# Altium footprint library RODION.PcbLib: 131 footprints (part 6 of 9)
Each footprint in its own frame and in the unit in brackets; x right, y up, seen from the top. Pads: shape width x height; smd on the part's side, far side on the other; paste and mask are expansions set on the pad; w line width, h text height; cw(c..) or ccw(c..) is an arc to the next point about the centre after c.
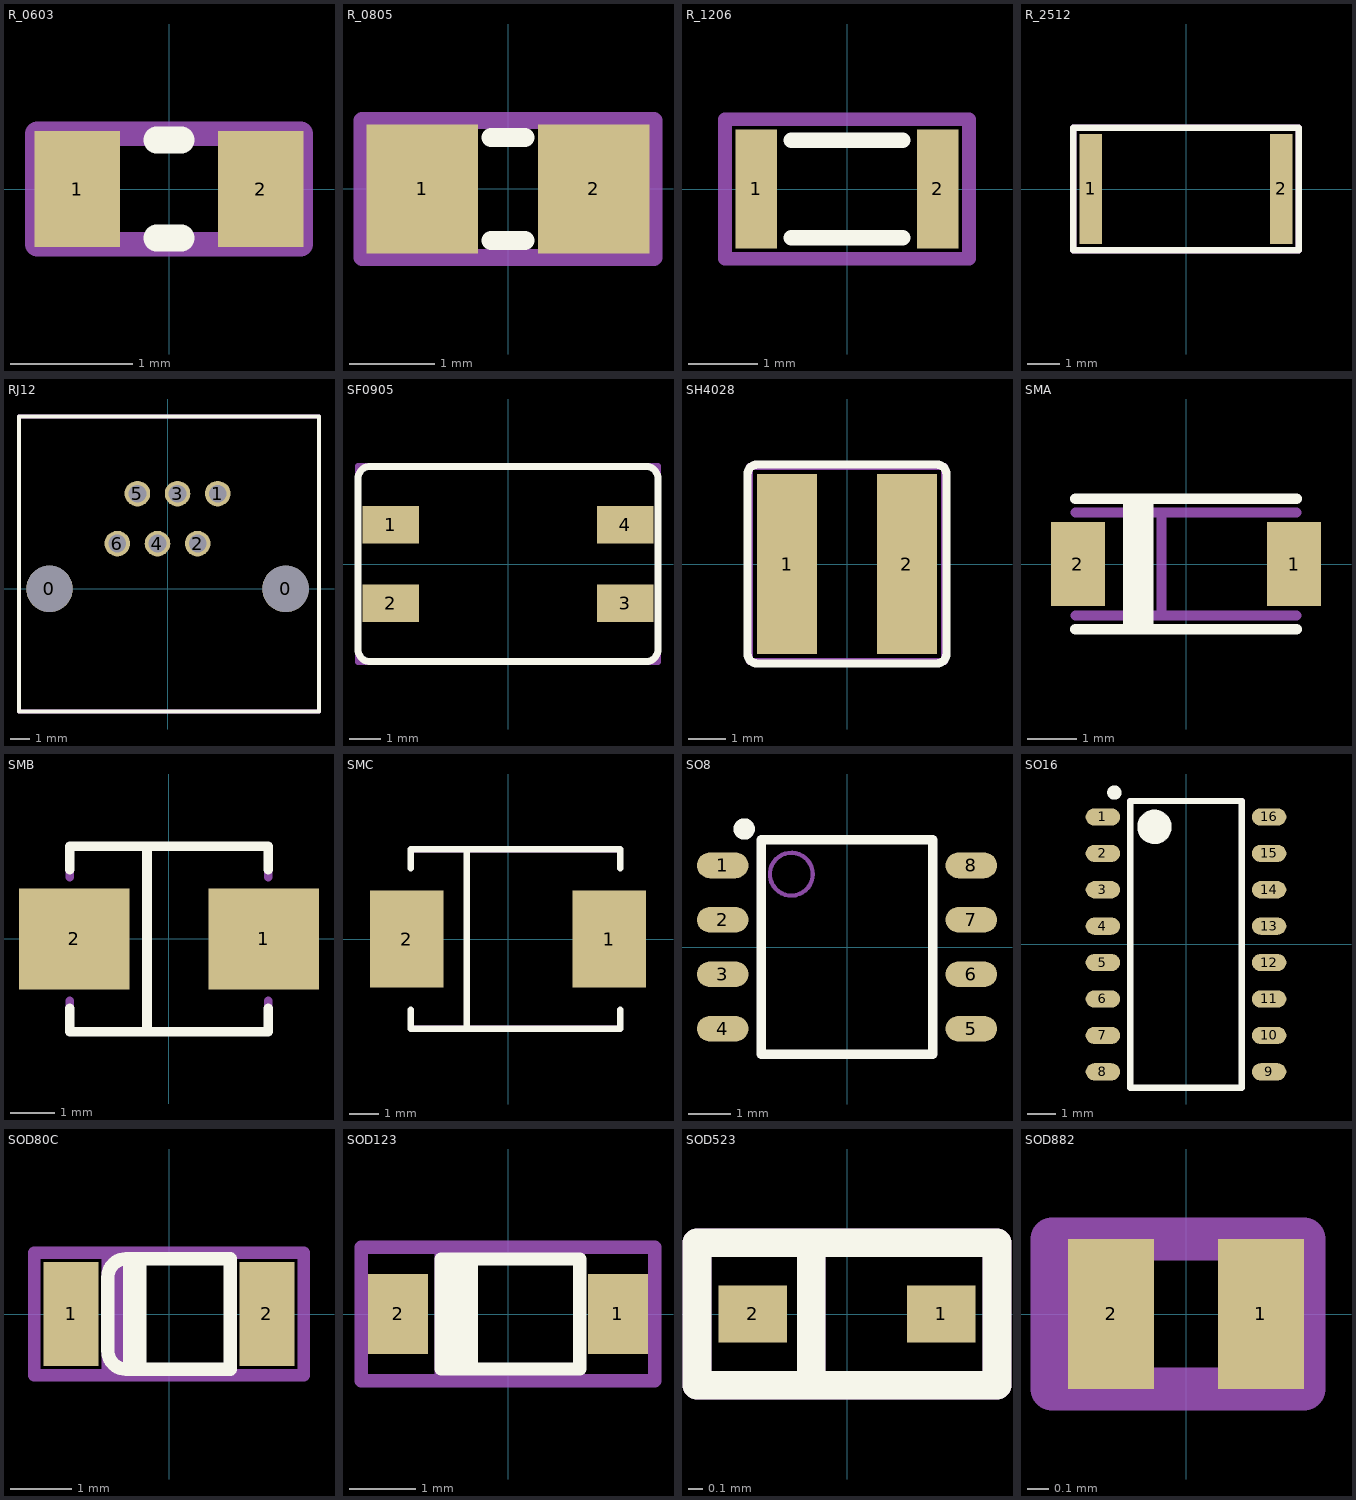
[diagram p5: the footprints below, top view; thin cyan lines are the x and y axes]

## R_0603 [mm] "Chip, Body 1.6x0.85mm, IPC High Density"
height 0.9
pads (2):
  rect 0.7x0.95 smd mask+0.05: 1(-0.75,0) 2(0.75,0)
Top Overlay:
  lines w0.22: -0.1,-0.4 0.1,-0.4 ; -0.1,0.4 0.1,0.4
Top_Assy:
  lines w0.2: -1.075,-0.45 -1.075,0.45 1.075,0.45 1.075,-0.45 -1.075,-0.45
  text ".Designator" at -1.775,-0.075 h1
3D body "RES0603.stp": height 0.45, standoff 0, extent -0.8,-0.4 0.8,0.4

## R_0805 [mm] "Chip, Body 1.6x0.85mm, IPC High Density"
height 0.45
pads (2):
  rect 1.3x1.5 smd: 1(-1,0) 2(1,0)
Top Overlay:
  lines w0.22: -0.2,-0.6 0.2,-0.6 ; -0.2,0.6 0.2,0.6
Top_Assy:
  lines w0.2: -1.7,-0.8 -1.7,0.8 1.7,0.8 1.7,-0.8 -1.7,-0.8
  text ".Designator" at -2.325,-0.4 h1
3D body "RES0805.stp": height 0.5, standoff 0, extent -1,-0.63 1,0.62

## R_1206 [mm] "Chip, Body 3.2x1.6mm, IPC High Density"
height 0.5
pads (2):
  rect 0.6x1.7 smd: 1(-1.3,0) 2(1.3,0)
Top Overlay:
  lines w0.22: -0.8,-0.7 0.8,-0.7 ; -0.8,0.7 0.8,0.7
Top_Assy:
  lines w0.2: -1.75,-1 1.75,-1 1.75,1 -1.75,1 -1.75,-1
  text ".Designator" at -1.575,-0.3 h1

## R_2512 [mm] "Chip, Body 6.35x3.2mm, IPC High Density"
height 0.55
pads (2):
  rect 0.7x3.4 smd: 1(-2.95,0) 2(2.95,0)
Top Overlay:
  lines w0.2: -3.5,-1.9 3.5,-1.9 3.5,1.9 -3.5,1.9 -3.5,-1.9
Top_Assy:
  lines w0.2: -3.5,-1.9 3.5,-1.9 3.5,1.9 -3.5,1.9 -3.5,-1.9
  text ".Designator" at -2.5,-0.275 h1
3D body "RES2512.stp": height 0.55, standoff 0, extent -3.15,-1.55 3.15,1.55

## RJ12 [mm] "Telephone connector"
height 14.5
pads (8):
  round 2.36 hole 2.36 unplated paste-1.1 mask+0.07: 0(-6,0) 0(6,0)
  round 1.3 hole 0.9 mask+0.07: 1(2.55,4.84) 2(1.53,2.3) 3(0.51,4.84) 4(-0.51,2.3) 5(-1.53,4.84) 6(-2.55,2.3)
Top Overlay:
  lines w0.2: -7.55,-6.225 7.7,-6.225 7.7,8.75 -7.55,8.75 -7.55,-6.225
Top_Assy:
  lines w0.2: -7.55,-6.225 -7.55,8.75 7.7,8.75 7.7,-6.225 -7.55,-6.225
  text ".Designator" at -1.375,-0.6 h1
3D body "RJ12.stp": height 12.5, standoff -3.8, extent -7.348,-6 7.348,8.5

## SF0905 [mm] "Chip Inductor, Body o7.5mm"
height 4
pads (4):
  rect 1.8x1.2 smd: 1(-3.75,1.25) 2(-3.75,-1.25) 3(3.75,-1.25) 4(3.75,1.25)
Top Overlay:
  lines w0.22: 4.409,-3.125 ccw(c4.409,-2.734) 4.8,-2.734 4.8,2.734 ccw(c4.409,2.734) 4.409,3.125 ; 4.5,-3.125 -4.409,-3.125 cw(c-4.409,-2.734) -4.8,-2.734 -4.8,2.734 cw(c-4.409,2.734) -4.409,3.125 4.5,3.125
Top_Assy:
  lines w0.2: -4.8,-3.125 -4.8,3.125 4.8,3.125 4.8,-3.125 -4.8,-3.125
  text ".Designator" at -4.7,-0.875 h1
3D body "SRF0905.STEP": height 4.6, standoff -0.4, extent -4.6,-3 4.6,3

## SH4028 [mm] "Chip Inductor, Body ¦4.8mm"
height 2.8
pads (2):
  rect 1.6x4.8 smd: 1(-1.6,0) 2(1.6,0)
Top Overlay:
  lines w0.22: 2.65,-2.4 cw(c2.4,-2.4) 2.4,-2.65 -2.4,-2.65 cw(c-2.4,-2.4) -2.65,-2.4 -2.65,2.4 cw(c-2.4,2.4) -2.4,2.65 2.4,2.65 cw(c2.4,2.4) 2.65,2.4 ; 2.65,-2.375 2.65,2.425
Top_Assy:
  lines w0.2: -2.6,-2.6 -2.6,2.6 2.6,2.6 2.6,-2.6 -2.6,-2.6
  text ".Designator" at -1.9,-0.225 h1
3D body "User Library-PSH4028.STEP": height 2.81, standoff 0, extent -2.4,-2.4 2.4,2.4

## SMA [mm] "SMA; 2 Leads"
height 2.5
pads (2):
  rect 1.1x1.7 smd: 1(2.2,0) 2(-2.2,0)
Top Overlay:
  lines w0.22: -2.25,-1.325 2.25,-1.325 ; -2.25,1.325 2.25,1.325 ; -1.175,-1.2 -1.175,1.2 ; -1.075,-1.2 -1.075,1.2 ; -0.925,-1.2 -0.925,1.2 ; -0.775,-1.2 -0.775,1.2
Top_Assy:
  lines w0.2: -2.25,-1.05 2.25,-1.05 ; -2.25,1.05 2.25,1.05 ; -0.5,-1.05 -0.5,1
  text ".Designator" at -0.6,-0.375 h1
3D body "Diode SMA.stp": height 2.41, standoff 0, extent -2.65,-1.46 2.63,1.46

## SMB [mm] "SMB; 2 Leads"
height 2.5
pads (2):
  rect 2.5x2.3 smd: 1(2.15,0) 2(-2.15,0)
Top Overlay:
  lines w0.22: -2.25,-1.575 -2.25,-2.1 2.25,-2.1 2.25,-1.575 ; -2.25,1.575 -2.25,2.1 2.25,2.1 2.25,1.575 ; -0.5,-2.1 -0.5,2.1
Top_Assy:
  lines w0.2: -2.25,-1.4 -2.25,-2.1 2.25,-2.1 2.25,-1.4 ; -2.25,1.4 -2.25,2.1 2.25,2.1 2.25,1.4 ; -0.5,-2.1 -0.5,2.1
  text ".Designator" at -0.25,-0.25 h1
3D body "SMB.STEP": height 2.45, standoff 0.03, extent -2.75,-1.95 2.75,1.95

## SMC [mm] "SMC; 2 Leads"
height 2.5
pads (2):
  rect 2.5x3.3 smd: 1(3.45,0) 2(-3.45,0)
Top Overlay:
  lines w0.22: -3.302,-2.413 -3.302,-3.048 3.81,-3.048 3.81,-2.413 ; -3.302,2.413 -3.302,3.048 3.81,3.048 3.81,2.413 ; -1.397,-3.048 -1.397,3.048
Top_Assy:
  lines w0.2: -3.3,-2.413 -3.3,-3.048 3.812,-3.048 3.812,-2.413 ; -3.3,2.413 -3.3,3.048 3.812,3.048 3.812,2.413 ; -1.395,-3.048 -1.395,3.048
  text ".Designator" at -0.675,-0.425 h1
3D body "SMC.step": height 2.4, standoff 0.03, extent -4.065,-3.05 4.065,3.05

## SO8 [mm] "SOIC, 8-Leads, Body 6.1x4.95mm, Pitch 1.27mm, IPC Medium Density"
height 1.75
pads (8):
  oval 1.2x0.6 smd: 1(-2.9,1.905) 2(-2.9,0.635) 3(-2.9,-0.635) 4(-2.9,-1.905) 5(2.9,-1.905) 6(2.9,-0.635) 7(2.9,0.635) 8(2.9,1.905)
Top Overlay:
  circle w0.25: c-2.4,2.755 r0.125
  lines w0.22: -2,-2.5 -2,2.5 2,2.5 2,-2.5 -2,-2.5
Top_Assy:
  circle w0.1: c-1.3,1.7 r0.5
  lines w0.2: -2,-2.5 -2,2.5 2,2.5 2,-2.5 -2,-2.5
  text ".Designator" at -1.825,-0.15 h1
3D body "User Library-so8-4.STEP": height 1.76, standoff -0.01, extent -3.068,-2.445 3.068,2.445

## SO16 [mm] "SOIC, 16-Leads, Body 9.9x3.8mm, Pitch 1.27mm, IPC Medium Density"
height 1.75
pads (16):
  oval 1.2x0.6 smd: 1(-2.9,4.445) 2(-2.9,3.175) 3(-2.9,1.905) 4(-2.9,0.635) 5(-2.9,-0.635) 6(-2.9,-1.905) 7(-2.9,-3.175) 8(-2.9,-4.445) 9(2.9,-4.445) 10(2.9,-3.175) 11(2.9,-1.905) 12(2.9,-0.635) 13(2.9,0.635) 14(2.9,1.905) 15(2.9,3.175) 16(2.9,4.445)
Top Overlay:
  circle w0.25: c-2.5,5.295 r0.125
  circle w0.6: c-1.1,4.1 r0.3
  lines w0.22: -1.95,-5 -1.95,5 1.95,5 1.95,-5 -1.95,-5
Top_Assy:
  circle w0.1: c-1.075,4.1 r0.5
  lines w0.2: -1.95,-5 -1.95,5 1.95,5 1.95,-5 -1.95,-5
  text ".Designator" at -1.8,-0.5 h1
3D body "SOIC-16-2.STEP": height 1.75, standoff 0, extent -3,-5 3,5

## SOD80C [mm] "Chip, Body 3.7x1.6mm"
height 1.6
pads (2):
  rect 0.9x1.7 smd: 1(-1.6,0) 2(1.6,0)
Top Overlay:
  region: -0.75,-0.9 -0.75,0.9 -0.75,0.92 -0.723,0.949 -0.683,0.952 -0.652,0.926 -0.65,0.906 -0.649,0.915 -0.64,0.932 -0.626,0.944 -0.609,0.95 -0.6,0.95 1,0.95 1.01,0.95 1.029,0.943 1.043,0.929 1.05,0.91 1.05,0.9 1.05,0.89 1.043,0.871 1.029,0.857 1.01,0.85 1,0.85 -0.375,0.85 -0.375,-0.85 1,-0.85 1.01,-0.85 1.029,-0.857 1.043,-0.871 1.05,-0.89 1.05,-0.9 1.05,-0.91 1.043,-0.929 1.029,-0.943 1.01,-0.95 1,-0.95 -0.7,-0.95 -0.71,-0.95 -0.729,-0.943 -0.743,-0.929 -0.75,-0.91
  lines w0.22: -0.625,0.9 -0.6,0.9 ; -0.45,0.9 -0.425,0.9 ; -0.7,0.9 ccw(c-0.7,0.6) -1,0.6 -1,-0.6 ccw(c-0.7,-0.6) -0.7,-0.9 1,-0.9 1,0.9 -0.6,0.9 ; -0.7,0.9 -0.6,0.9 ; -0.7,0.9 -0.7,0.9
Top_Assy:
  lines w0.2: -1,-1 -1,1 ; -0.8,-1 -0.8,1 ; -2.2,-1 2.2,-1 2.2,1 -2.2,1 -2.2,-1
  text ".Designator" at -0.5,-0.5 h1
3D body "MiniMelf (SOD80, DO-213AC).step": height 1.6, standoff 0, extent -1.88,-0.8 1.82,0.8

## SOD123 [mm] "Chip, Body 2.7x1.6mm"
height 1.17
pads (2):
  rect 0.9x1.2 smd: 1(1.65,0) 2(-1.65,0)
Top Overlay:
  lines w0.2: -0.85,-0.825 -0.85,0.825 ; -0.7,-0.825 -0.7,0.825 ; -0.55,-0.825 -0.55,0.825 ; -1,-0.825 -1,0.825 1.075,0.825 1.075,-0.825 -1,-0.825
Top_Assy:
  lines w0.2: -1,-1 -1,1 ; -0.8,-1 -0.8,1 ; -2.2,-1 2.2,-1 2.2,1 -2.2,1 -2.2,-1
  text ".Designator" at -0.3,-0.4 h1
3D body "SOD123.step": height 1.35, standoff 0, extent -1.85,-0.775 1.85,0.775

## SOD523 [mm] "Chip, Body 1.6x0.8 mm"
height 0.6
pads (2):
  rect 0.48x0.4 smd: 1(0.66,0) 2(-0.66,0)
Top Overlay:
  lines w0.2: -0.25,-0.45 -0.25,0.5 ; -1.05,-0.5 1.05,-0.5 1.05,0.5 -1.05,0.5 -1.05,-0.5
Top_Assy:
  lines w0.2: -0.25,-0.45 -0.25,0.5 ; -1.05,-0.5 1.05,-0.5 1.05,0.5 -1.05,0.5 -1.05,-0.5
  text ".Designator" at -0.75,0.875 h1
3D body "SOD523.step": height 0.7, standoff 0, extent -0.8,-0.399 0.8,0.399

## SOD882 [mm] "Chip, Body 0.98x0.58mm"
height 0.5
pads (2):
  rect 0.4x0.7 smd paste-0.05: 1(0.35,0) 2(-0.35,0)
Top_Assy:
  lines w0.2: -0.25,-0.35 -0.25,0.35 ; -0.625,-0.35 -0.625,0.35 0.55,0.35 0.55,-0.35 -0.625,-0.35
  text ".Designator" at -0.5,0.7 h1
3D body "SOD882.step": height 0.48, standoff -0.03, extent -0.492,-0.293 0.493,0.293